# Altium footprint library general.PcbLib: 66 footprints (part 2 of 5)
Each footprint in its own frame and in the unit in brackets; x right, y up, seen from the top. Pads: shape width x height; smd on the part's side, far side on the other; paste and mask are expansions set on the pad; w line width, h text height; cw(c..) or ccw(c..) is an arc to the next point about the centre after c.
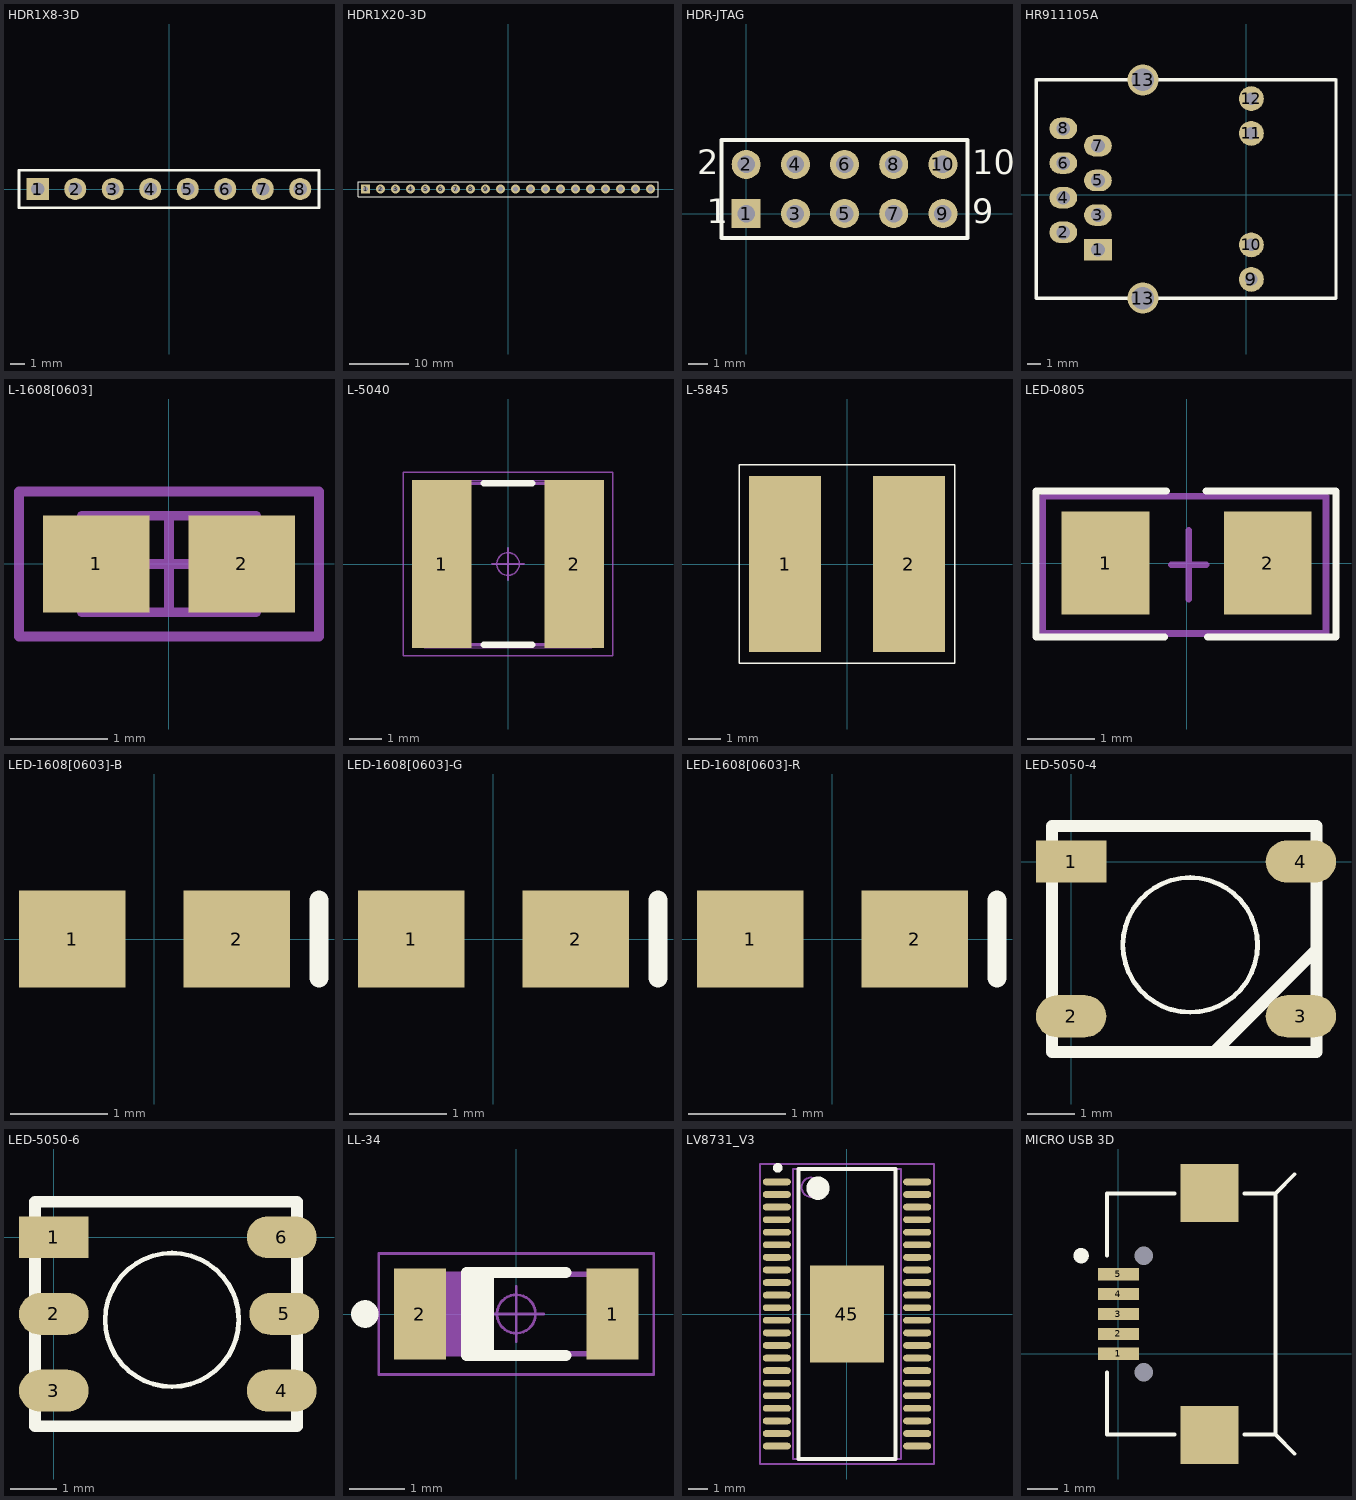
[diagram p1: the footprints below, top view; thin cyan lines are the x and y axes]

## HDR1X8-3D [mm] "Connector; Header; 8 Position"
pads (8):
  rect 1.5x1.5 hole 0.9: 1(-8.89,0)
  round 1.5 hole 0.9: 2(-6.35,0) 3(-3.81,0) 4(-1.27,0) 5(1.27,0) 6(3.81,0) 7(6.35,0) 8(8.89,0)
Top Overlay:
  lines w0.2: -10.16,-1.27 10.16,-1.27 10.16,1.27 -10.16,1.27 -10.16,-1.27
3D body: height 8.6, standoff -2.94, extent -10.135,-1.27 10.185,1.27

## HDR1X20-3D [mm] "Connector; Header; 20 Position"
pads (20):
  rect 1.5x1.5 hole 0.9: 1(-24.13,0)
  round 1.5 hole 0.9: 2(-21.59,0) 3(-19.05,0) 4(-16.51,0) 5(-13.97,0) 6(-11.43,0) 7(-8.89,0) 8(-6.35,0) 9(-3.81,0) 10(-1.27,0) 11(1.27,0) 12(3.81,0) 13(6.35,0) 14(8.89,0) 15(11.43,0) 16(13.97,0) 17(16.51,0) 18(19.05,0) 19(21.59,0) 20(24.13,0)
Top Overlay:
  lines w0.2: -25.4,-1.27 25.4,-1.27 25.4,1.27 -23.495,1.27 -25.4,1.27 -25.4,-1.27
3D body: height 8.6, standoff -2.94, extent -25.4,-1.27 25.4,1.27

## HDR-JTAG [mm]
pads (10):
  rect 1.5x1.5 hole 0.9: 1(0,0)
  round 1.5 hole 0.9: 2(0,2.54) 3(2.54,0) 4(2.54,2.54) 5(5.08,0) 6(5.08,2.54) 7(7.62,0) 8(7.62,2.54) 9(10.16,0) 10(10.16,2.54)
Top Overlay:
  lines w0.2: -1.27,-1.27 -1.27,3.81 11.43,3.81 11.43,-1.27 -1.27,-1.27
  text "2" at -2.54,2.032 h1.27
  text "1" at -2.032,-0.508 h1.27
  text "9" at 11.684,-0.508 h1.27
  text "10" at 11.684,2.032 h1.27
3D body: height 9.86, standoff -3.05, extent -5.08,-3.302 15.24,5.842

## HR911105A [mil] "HR911105A"
pads (14):
  rect 80x62 hole 40: 1(-429,-159)
  oval 80x62 hole 40: 2(-529,-109) 3(-429,-59) 4(-529,-9) 5(-429,41) 6(-529,91) 7(-429,141) 8(-529,191)
  round 72 hole 36: 9(13.91,-244.63) 10(13.91,-145) 11(13.91,176.87) 12(13.91,277)
  round 90 hole 65: 13(-299.08,-298.76) 13(-299.08,331.16)
Top Overlay:
  lines w10: -607.74,-299 -607.5,-298.76 ; -607.74,331 -607.58,331.16 ; -607.58,331.16 -299.08,331.16 258.24,331.16 258.4,331 258.4,-299 258.17,-298.76 -299.08,-298.76 -607.5,-298.76 ; -607.58,331.16 -607.58,-298.69 -607.5,-298.76
Multi-Layer:
  circle w5: c-169,-209 r70.8
  circle w5: c-169,241 r70.8

## L-1608[0603] [mm] "Chip Inductor, Body 1.6x0.8mm, IPC Medium Density"
height 1
pads (2):
  rect 1.1x1 smd: 1(-0.75,0) 2(0.75,0)
Mechanical 13:
  lines w0.1: -0.9,-0.5 -0.9,0.5 0.9,0.5 0.9,-0.5 -0.9,-0.5
Mechanical 15:
  lines w0.1: -0.5,0 0.5,0 ; 0,-0.5 0,0.5 ; -1.55,-0.75 -1.55,0.75 1.55,0.75 1.55,-0.75 -1.55,-0.75
3D body: height 0.45, standoff 0, extent -0.8,-0.406 0.8,0.394

## L-5040 [mm]
pads (2):
  rect 1.85x5.2 smd: 1(-2.05,0) 2(2.05,0)
Top Overlay:
  lines w0.2: -0.75,-2.5 0.75,-2.5 ; -0.75,2.5 0.75,2.5
Mechanical 15:
  lines w0.1: -2.5,-2.5 2.5,-2.5 2.5,2.5 -2.5,2.5 -2.5,-2.5
Mechanical 16:
  circle w0.05: c0,0 r0.35
  lines w0.001: -2.6,-2.6 2.6,-2.6 2.6,2.6 -2.6,2.6 -2.6,-2.6
  lines w0.05: -0.5,0 0.5,0 ; 0,-0.5 0,0.5 ; -3.25,-2.85 -3.25,2.85 3.25,2.85 3.25,-2.85 -3.25,-2.85

## L-5845 [mm]
pads (2):
  rect 2.2x5.4 smd: 1(-1.9,0) 2(1.9,0)
Top Overlay:
  lines w0.05: -3.302,-3.048 -3.302,3.048 3.302,3.048 3.302,-3.048 -3.302,-3.048

## LED-0805 [mm]
pads (2):
  rect 1.3x1.524 smd: 1(-1.2,0) 2(1.2,0)
Top Overlay:
  lines w0.102: -0.324,-1.092 -2.229,-1.092 -2.229,1.067 -0.298,1.067 ; 0.286,1.067 2.21,1.067 2.21,-1.092 0.311,-1.092
Mechanical 15:
  lines w0.1: -0.222,-0.025 0.286,-0.025 ; 0.032,-0.533 0.032,0.483 ; -2.127,-1.041 2.064,-1.041 2.064,0.991 -2.127,0.991 -2.127,-1.041
3D body: height 1.07, standoff -0.03, extent -1.6,-0.8 1.6,0.8

## LED-1608[0603]-B [mm] "Chip Diode; Body 1.6 x 0.8 mm (LxW typ)"
height 0.85
pads (2):
  rect 1.1x1 smd: 1(-0.85,0) 2(0.85,0)
Top Overlay:
  lines w0.2: 1.7,-0.4 1.7,0.4
3D body: height 0.9, standoff 0, extent -0.85,-0.443 0.85,0.457

## LED-1608[0603]-G [mm] "Chip Diode; Body 1.6 x 0.8 mm (LxW typ)"
height 0.85
pads (2):
  rect 1.1x1 smd: 1(-0.85,0) 2(0.85,0)
Top Overlay:
  lines w0.2: 1.7,-0.4 1.7,0.4
3D body: height 0.9, standoff 0, extent -0.85,-0.443 0.85,0.457

## LED-1608[0603]-R [mm] "Chip Diode; Body 1.6 x 0.8 mm (LxW typ)"
height 0.85
pads (2):
  rect 1.1x1 smd: 1(-0.85,0) 2(0.85,0)
Top Overlay:
  lines w0.2: 1.7,-0.4 1.7,0.4
3D body: height 0.9, standoff 0, extent -0.825,-0.443 0.875,0.457

## LED-5050-4 [mm]
pads (4):
  rect 1.5x0.9 smd: 1(0,0)
  oval 1.5x0.9 smd: 2(0,-3.3) 3(4.9,-3.3) 4(4.9,0)
Top Overlay:
  circle w0.102: c2.54,-1.778 r1.437
  lines w0.254: 3.048,-4.064 5.207,-1.905 ; -0.406,-4.064 5.232,-4.064 5.232,0.762 -0.406,0.762 -0.406,-4.064

## LED-5050-6 [mm]
pads (6):
  rect 1.5x0.9 smd: 1(0,0)
  oval 1.5x0.9 smd: 2(0,-1.649) 3(0,-3.3) 4(4.9,-3.3) 5(4.953,-1.649) 6(4.9,0)
Top Overlay:
  circle w0.102: c2.54,-1.778 r1.437
  lines w0.254: -0.406,-4.064 5.232,-4.064 5.232,0.762 -0.406,0.762 -0.406,-4.064
3D body: height 1.6, standoff 0, extent -0.232,-4.177 5.068,0.823

## LL-34 [mm]
pads (2):
  rect 0.95x1.65 smd: 1(1.75,0) 2(-1.75,0)
Top Overlay:
  circle w0.25: c-2.75,0 r0.125
  lines w0.2: -0.7,-0.75 -0.7,0.75 ; -0.5,-0.75 -0.5,0.75 ; 0.9,-0.75 -0.9,-0.75 -0.9,0.75 0.9,0.75
Mechanical 15:
  lines w0.1: -1.65,-0.725 -1.65,0.725 ; -1.55,-0.725 -1.55,0.725 ; -1.45,-0.725 -1.45,0.725 ; -1.35,-0.725 -1.35,0.725 ; -1.25,-0.725 -1.25,0.725 ; -1.15,-0.725 -1.15,0.725 ; -1.05,-0.725 -1.05,0.725 ; -1.75,-0.725 -1.75,0.725 1.75,0.725 1.75,-0.725 -1.75,-0.725
Mechanical 16:
  circle w0.05: c0,0 r0.35
  lines w0.001: -1.8,-0.75 -1.8,0.75 1.8,0.75 1.8,-0.75 -1.8,-0.75
  lines w0.05: -0.5,0 0.5,0 ; 0,-0.5 0,0.5 ; -2.5,-1.1 -2.5,1.1 2.5,1.1 2.5,-1.1 -2.5,-1.1
3D body: height -0.4, standoff -1.9, extent -1.75,-0.75 1.75,0.75

## LV8731_V3 [mm] "SOP, 44-Leads, Body 15.0x5.6mm (max), Pitch 0.65mm, IPC Medium Density"
height 1.7
pads (45):
  oval 1.45x0.35 smd: 1(-3.625,6.825) 2(-3.625,6.175) 3(-3.625,5.525) 4(-3.625,4.875) 5(-3.625,4.225) 6(-3.625,3.575) 7(-3.625,2.925) 8(-3.625,2.275) 9(-3.625,1.625) 10(-3.625,0.975) 11(-3.625,0.325) 12(-3.625,-0.325) 13(-3.625,-0.975) 14(-3.625,-1.625) 15(-3.625,-2.275) 16(-3.625,-2.925) 17(-3.625,-3.575) 18(-3.625,-4.225) 19(-3.625,-4.875) 20(-3.625,-5.525) 21(-3.625,-6.175) 22(-3.625,-6.825) 23(3.625,-6.825) 24(3.625,-6.175) 25(3.625,-5.525) 26(3.625,-4.875) 27(3.625,-4.225) 28(3.625,-3.575) 29(3.625,-2.925) 30(3.625,-2.275) 31(3.625,-1.625) 32(3.625,-0.975) 33(3.625,-0.325) 34(3.625,0.325) 35(3.625,0.975) 36(3.625,1.625) 37(3.625,2.275) 38(3.625,2.925) 39(3.625,3.575) 40(3.625,4.225) 41(3.625,4.875) 42(3.625,5.525) 43(3.625,6.175) 44(3.625,6.825)
  rect 3.8x5 smd: 45(0,0)
Top Overlay:
  circle w0.25: c-3.575,7.55 r0.125
  circle w0.6: c-1.5,6.5 r0.3
  lines w0.2: -2.5,-7.5 -2.5,7.5 2.5,7.5 2.5,-7.5 -2.5,-7.5
Mechanical 13:
  circle w0.1: c-1.85,6.55 r0.5
  lines w0.1: -2.8,-7.5 -2.8,7.5 2.8,7.5 2.8,-7.5 -2.8,-7.5
Mechanical 15:
  lines w0.1: -0.5,0 0.5,0 ; 0,-0.5 0,0.5 ; -4.5,-7.75 -4.5,7.75 4.5,7.75 4.5,-7.75 -4.5,-7.75
3D body: height 1.7, standoff 0.2, extent -2.8,-7.5 2.8,7.5

## MICRO USB 3D [mm]
pads (9):
  rect 1.35x0.4 smd: 1(0,0) 2(0,0.65) 3(0,1.3) 4(0,1.95) 5(0,2.6)
  round 0 hole 0.6: HOLE(0.827,-0.6) HOLE(0.827,3.2)
  rect 1.9x1.9 smd: ""(2.977,-2.65) ""(2.977,5.25)
Top Overlay:
  circle w0.25: c-1.221,3.205 r0.125
  lines w0.127: -0.381,-2.637 1.825,-2.637 ; -0.381,-2.6 -0.381,-0.605 ; -0.381,3.205 -0.381,5.2 ; -0.381,5.237 1.825,5.237 ; 4.111,-2.637 5.127,-2.637 5.757,-3.267 ; 4.111,5.237 5.127,5.237 5.757,5.867 ; 5.127,-2.6 5.127,5.2
3D body: height 2.79, standoff -0.28, extent -0.291,-3.13 5.334,5.67